# Altium schematic symbol library jlcpcb_2025_04_capacitors_extended_0402.schlib: 3594 symbols (part 14 of 20) (continued)
## GJM1555C1H120FB01D
designator C?  Capacitance: 12pF  (hidden comment: *)
Capacitor, Ceramic (MLCC), 12pF, ±1%, 50V, C0G, ±1%, SMD 0402; Manufacturer: Murata Electronics; Manufacturer Part Number: GJM1555C1H120FB01D; Package Size: 0402; JLCPCB Basic Part: No; JLCPCB Part Number: C161304; Supplier 1: LCSC; Category: Capacitors - MLCC; Supplier Part Number 1: C161304; Tolerance: ±1%; Voltage Rating: 50V; Temperature Coefficient: C0G; RoHS: Yes; ComponentLink1Description: Datasheet; ComponentLink1URL: https://wmsc.lcsc.com/wmsc/upload/file/pdf/v2/lcsc/2304140030_Murata-Electronics-GJM1555C1H120FB01D_C161304.pdf; ComponentLink2Description: JLCPCB Part URL; ComponentLink2URL: https://jlcpcb.com/partdetail/C161304; ComponentLink3Description: LCSC Part URL; ComponentLink3URL: https://lcsc.com/product-detail/Multilayer-Ceramic-Capacitors-MLCC---SMD-SMT_Murata-Electronics-Murata-Electronics-GJM1555C1H120FB01D_C161304.html
footprint CAP-0402 (0402 (1005M) Capacitor)
pins: 1, 2

## GJM1555C1H120GB01D
designator C?  Capacitance: 12pF  (hidden comment: *)
Capacitor, Ceramic (MLCC), 12pF, ±2%, 50V, C0G, ±2%, SMD 0402; Manufacturer: Murata Electronics; Manufacturer Part Number: GJM1555C1H120GB01D; Package Size: 0402; JLCPCB Basic Part: No; JLCPCB Part Number: C161305; Supplier 1: LCSC; Category: Capacitors - MLCC; Supplier Part Number 1: C161305; Tolerance: ±2%; Voltage Rating: 50V; Temperature Coefficient: C0G; RoHS: Yes; ComponentLink1Description: Datasheet; ComponentLink1URL: https://wmsc.lcsc.com/wmsc/upload/file/pdf/v2/lcsc/2304140030_Murata-Electronics-GJM1555C1H120GB01D_C161305.pdf; ComponentLink2Description: JLCPCB Part URL; ComponentLink2URL: https://jlcpcb.com/partdetail/C161305; ComponentLink3Description: LCSC Part URL; ComponentLink3URL: https://lcsc.com/product-detail/Multilayer-Ceramic-Capacitors-MLCC---SMD-SMT_Murata-Electronics-Murata-Electronics-GJM1555C1H120GB01D_C161305.html
footprint CAP-0402 (0402 (1005M) Capacitor)
pins: 1, 2

## GJM1555C1H120JB01D
designator C?  Capacitance: 12pF  (hidden comment: *)
Capacitor, Ceramic (MLCC), 12pF, ±5%, 50V, C0G, ±5%, SMD 0402; Manufacturer: Murata Electronics; Manufacturer Part Number: GJM1555C1H120JB01D; Package Size: 0402; JLCPCB Basic Part: No; JLCPCB Part Number: C85875; Supplier 1: LCSC; Category: Capacitors - MLCC; Supplier Part Number 1: C85875; Tolerance: ±5%; Voltage Rating: 50V; Temperature Coefficient: C0G; RoHS: Yes; ComponentLink1Description: Datasheet; ComponentLink1URL: https://wmsc.lcsc.com/wmsc/upload/file/pdf/v2/lcsc/2304140030_Murata-Electronics-GJM1555C1H120JB01D_C85875.pdf; ComponentLink2Description: JLCPCB Part URL; ComponentLink2URL: https://jlcpcb.com/partdetail/C85875; ComponentLink3Description: LCSC Part URL; ComponentLink3URL: https://lcsc.com/product-detail/Multilayer-Ceramic-Capacitors-MLCC---SMD-SMT_Murata-Electronics-Murata-Electronics-GJM1555C1H120JB01D_C85875.html
footprint CAP-0402 (0402 (1005M) Capacitor)
pins: 1, 2

## GJM1555C1H130FB01D
designator C?  Capacitance: 13pF  (hidden comment: *)
Capacitor, Ceramic (MLCC), 13pF, ±1%, 50V, C0G, ±1%, SMD 0402; Manufacturer: Murata Electronics; Manufacturer Part Number: GJM1555C1H130FB01D; Package Size: 0402; JLCPCB Basic Part: No; JLCPCB Part Number: C161306; Supplier 1: LCSC; Category: Capacitors - MLCC; Supplier Part Number 1: C161306; Tolerance: ±1%; Voltage Rating: 50V; Temperature Coefficient: C0G; RoHS: Yes; ComponentLink1Description: Datasheet; ComponentLink1URL: https://wmsc.lcsc.com/wmsc/upload/file/pdf/v2/lcsc/2304140030_Murata-Electronics-GJM1555C1H130FB01D_C161306.pdf; ComponentLink2Description: JLCPCB Part URL; ComponentLink2URL: https://jlcpcb.com/partdetail/C161306; ComponentLink3Description: LCSC Part URL; ComponentLink3URL: https://lcsc.com/product-detail/Multilayer-Ceramic-Capacitors-MLCC---SMD-SMT_Murata-Electronics-Murata-Electronics-GJM1555C1H130FB01D_C161306.html
footprint CAP-0402 (0402 (1005M) Capacitor)
pins: 1, 2

## GJM1555C1H130GB01D
designator C?  Capacitance: 13pF  (hidden comment: *)
Capacitor, Ceramic (MLCC), 13pF, ±2%, 50V, null, ±2%, SMD 0402; Manufacturer: Murata Electronics; Manufacturer Part Number: GJM1555C1H130GB01D; Package Size: 0402; JLCPCB Basic Part: No; JLCPCB Part Number: C2167421; Supplier 1: LCSC; Category: Capacitors - MLCC; Supplier Part Number 1: C2167421; Tolerance: ±2%; Voltage Rating: 50V; Temperature Coefficient: null; RoHS: Yes; ComponentLink1Description: Datasheet; ComponentLink1URL: https://wmsc.lcsc.com/wmsc/upload/file/pdf/v2/lcsc/2202040230_Murata-Electronics-GJM1555C1H130GB01D_C2167421.pdf; ComponentLink2Description: JLCPCB Part URL; ComponentLink2URL: https://jlcpcb.com/partdetail/C2167421; ComponentLink3Description: LCSC Part URL; ComponentLink3URL: https://lcsc.com/product-detail/Multilayer-Ceramic-Capacitors-MLCC---SMD-SMT_Murata-Electronics-Murata-Electronics-GJM1555C1H130GB01D_C2167421.html
footprint CAP-0402 (0402 (1005M) Capacitor)
pins: 1, 2

## GJM1555C1H130JB01D
designator C?  Capacitance: 13pF  (hidden comment: *)
Capacitor, Ceramic (MLCC), 13pF, ±5%, null, null, ±5%, SMD 0402; Manufacturer: Murata Electronics; Manufacturer Part Number: GJM1555C1H130JB01D; Package Size: 0402; JLCPCB Basic Part: No; JLCPCB Part Number: C426082; Supplier 1: LCSC; Category: Capacitors - MLCC; Supplier Part Number 1: C426082; Tolerance: ±5%; Voltage Rating: null; Temperature Coefficient: null; RoHS: Yes; ComponentLink1Description: Datasheet; ComponentLink1URL: https://wmsc.lcsc.com/wmsc/upload/file/pdf/v2/lcsc/2304140030_Murata-Electronics-GJM1555C1H130JB01D_C426082.pdf; ComponentLink2Description: JLCPCB Part URL; ComponentLink2URL: https://jlcpcb.com/partdetail/C426082; ComponentLink3Description: LCSC Part URL; ComponentLink3URL: https://lcsc.com/product-detail/Multilayer-Ceramic-Capacitors-MLCC---SMD-SMT_Murata-Electronics-Murata-Electronics-GJM1555C1H130JB01D_C426082.html
footprint CAP-0402 (0402 (1005M) Capacitor)
pins: 1, 2

## GJM1555C1H150FB01D
designator C?  Capacitance: 15pF  (hidden comment: *)
Capacitor, Ceramic (MLCC), 15pF, ±1%, 50V, C0G, ±1%, SMD 0402; Manufacturer: Murata Electronics; Manufacturer Part Number: GJM1555C1H150FB01D; Package Size: 0402; JLCPCB Basic Part: No; JLCPCB Part Number: C441742; Supplier 1: LCSC; Category: Capacitors - MLCC; Supplier Part Number 1: C441742; Tolerance: ±1%; Voltage Rating: 50V; Temperature Coefficient: C0G; RoHS: Yes; ComponentLink1Description: Datasheet; ComponentLink1URL: https://wmsc.lcsc.com/wmsc/upload/file/pdf/v2/lcsc/2304140030_Murata-Electronics-GJM1555C1H150FB01D_C441742.pdf; ComponentLink2Description: JLCPCB Part URL; ComponentLink2URL: https://jlcpcb.com/partdetail/C441742; ComponentLink3Description: LCSC Part URL; ComponentLink3URL: https://lcsc.com/product-detail/Multilayer-Ceramic-Capacitors-MLCC---SMD-SMT_Murata-Electronics-Murata-Electronics-GJM1555C1H150FB01D_C441742.html
footprint CAP-0402 (0402 (1005M) Capacitor)
pins: 1, 2

## GJM1555C1H150GB01D
designator C?  Capacitance: 15pF  (hidden comment: *)
Capacitor, Ceramic (MLCC), 15pF, ±2%, null, null, ±2%, SMD 0402; Manufacturer: Murata Electronics; Manufacturer Part Number: GJM1555C1H150GB01D; Package Size: 0402; JLCPCB Basic Part: No; JLCPCB Part Number: C440152; Supplier 1: LCSC; Category: Capacitors - MLCC; Supplier Part Number 1: C440152; Tolerance: ±2%; Voltage Rating: null; Temperature Coefficient: null; RoHS: Yes; ComponentLink1Description: Datasheet; ComponentLink1URL: https://wmsc.lcsc.com/wmsc/upload/file/pdf/v2/lcsc/2304140030_Murata-Electronics-GJM1555C1H150GB01D_C440152.pdf; ComponentLink2Description: JLCPCB Part URL; ComponentLink2URL: https://jlcpcb.com/partdetail/C440152; ComponentLink3Description: LCSC Part URL; ComponentLink3URL: https://lcsc.com/product-detail/Multilayer-Ceramic-Capacitors-MLCC---SMD-SMT_Murata-Electronics-Murata-Electronics-GJM1555C1H150GB01D_C440152.html
footprint CAP-0402 (0402 (1005M) Capacitor)
pins: 1, 2

## GJM1555C1H150JB01D
designator C?  Capacitance: 15pF  (hidden comment: *)
Capacitor, Ceramic (MLCC), 15pF, ±5%, 50V, C0G, ±5%, SMD 0402; Manufacturer: Murata Electronics; Manufacturer Part Number: GJM1555C1H150JB01D; Package Size: 0402; JLCPCB Basic Part: No; JLCPCB Part Number: C88877; Supplier 1: LCSC; Category: Capacitors - MLCC; Supplier Part Number 1: C88877; Tolerance: ±5%; Voltage Rating: 50V; Temperature Coefficient: C0G; RoHS: Yes; ComponentLink1Description: Datasheet; ComponentLink1URL: https://wmsc.lcsc.com/wmsc/upload/file/pdf/v2/lcsc/2304140030_Murata-Electronics-GJM1555C1H150JB01D_C88877.pdf; ComponentLink2Description: JLCPCB Part URL; ComponentLink2URL: https://jlcpcb.com/partdetail/C88877; ComponentLink3Description: LCSC Part URL; ComponentLink3URL: https://lcsc.com/product-detail/Multilayer-Ceramic-Capacitors-MLCC---SMD-SMT_Murata-Electronics-Murata-Electronics-GJM1555C1H150JB01D_C88877.html
footprint CAP-0402 (0402 (1005M) Capacitor)
pins: 1, 2

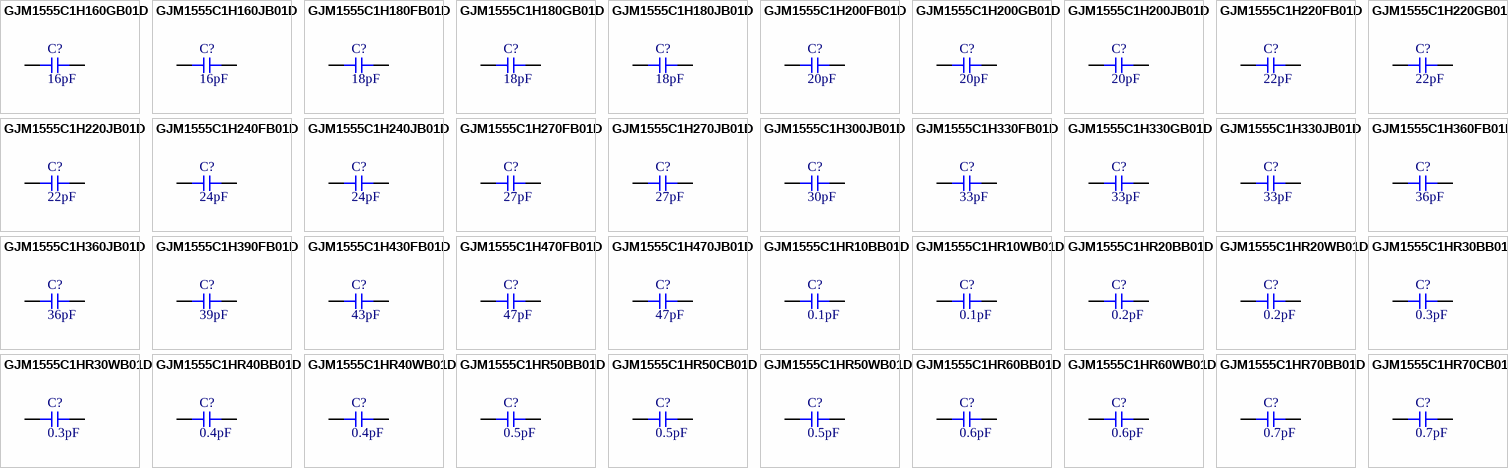
[diagram p64: symbols GJM1555C1H160GB01D to GJM1555C1HR70CB01D]

## GJM1555C1H160GB01D
designator C?  Capacitance: 16pF  (hidden comment: *)
Capacitor, Ceramic (MLCC), 16pF, ±2%, 50V, C0G, ±2%, SMD 0402; Manufacturer: Murata Electronics; Manufacturer Part Number: GJM1555C1H160GB01D; Package Size: 0402; JLCPCB Basic Part: No; JLCPCB Part Number: C161307; Supplier 1: LCSC; Category: Capacitors - MLCC; Supplier Part Number 1: C161307; Tolerance: ±2%; Voltage Rating: 50V; Temperature Coefficient: C0G; RoHS: Yes; ComponentLink1Description: Datasheet; ComponentLink1URL: https://wmsc.lcsc.com/wmsc/upload/file/pdf/v2/lcsc/1811081532_Murata-Electronics-GJM1555C1H160GB01D_C161307.pdf; ComponentLink2Description: JLCPCB Part URL; ComponentLink2URL: https://jlcpcb.com/partdetail/C161307; ComponentLink3Description: LCSC Part URL; ComponentLink3URL: https://lcsc.com/product-detail/Multilayer-Ceramic-Capacitors-MLCC---SMD-SMT_Murata-Electronics-Murata-Electronics-GJM1555C1H160GB01D_C161307.html
footprint CAP-0402 (0402 (1005M) Capacitor)
pins: 1, 2

## GJM1555C1H160JB01D
designator C?  Capacitance: 16pF  (hidden comment: *)
Capacitor, Ceramic (MLCC), 16pF, ±5%, 50V, null, ±5%, SMD 0402; Manufacturer: Murata Electronics; Manufacturer Part Number: GJM1555C1H160JB01D; Package Size: 0402; JLCPCB Basic Part: No; JLCPCB Part Number: C2217274; Supplier 1: LCSC; Category: Capacitors - MLCC; Supplier Part Number 1: C2217274; Tolerance: ±5%; Voltage Rating: 50V; Temperature Coefficient: null; RoHS: Yes; ComponentLink1Description: Datasheet; ComponentLink1URL: https://wmsc.lcsc.com/wmsc/upload/file/pdf/v2/lcsc/2104171546_Murata-Electronics-GJM1555C1H160JB01D_C2217274.pdf; ComponentLink2Description: JLCPCB Part URL; ComponentLink2URL: https://jlcpcb.com/partdetail/C2217274; ComponentLink3Description: LCSC Part URL; ComponentLink3URL: https://lcsc.com/product-detail/Multilayer-Ceramic-Capacitors-MLCC---SMD-SMT_Murata-Electronics-Murata-Electronics-GJM1555C1H160JB01D_C2217274.html
footprint CAP-0402 (0402 (1005M) Capacitor)
pins: 1, 2

## GJM1555C1H180FB01D
designator C?  Capacitance: 18pF  (hidden comment: *)
Capacitor, Ceramic (MLCC), 18pF, ±1%, 50V, C0G, ±1%, SMD 0402; Manufacturer: Murata Electronics; Manufacturer Part Number: GJM1555C1H180FB01D; Package Size: 0402; JLCPCB Basic Part: No; JLCPCB Part Number: C237497; Supplier 1: LCSC; Category: Capacitors - MLCC; Supplier Part Number 1: C237497; Tolerance: ±1%; Voltage Rating: 50V; Temperature Coefficient: C0G; RoHS: Yes; ComponentLink1Description: Datasheet; ComponentLink1URL: https://wmsc.lcsc.com/wmsc/upload/file/pdf/v2/lcsc/1912111437_Murata-Electronics-GJM1555C1H180FB01D_C237497.pdf; ComponentLink2Description: JLCPCB Part URL; ComponentLink2URL: https://jlcpcb.com/partdetail/C237497; ComponentLink3Description: LCSC Part URL; ComponentLink3URL: https://lcsc.com/product-detail/Multilayer-Ceramic-Capacitors-MLCC---SMD-SMT_Murata-Electronics-Murata-Electronics-GJM1555C1H180FB01D_C237497.html
footprint CAP-0402 (0402 (1005M) Capacitor)
pins: 1, 2

## GJM1555C1H180GB01D
designator C?  Capacitance: 18pF  (hidden comment: *)
Capacitor, Ceramic (MLCC), 18pF, ±2%, 50V, C0G, ±2%, SMD 0402; Manufacturer: Murata Electronics; Manufacturer Part Number: GJM1555C1H180GB01D; Package Size: 0402; JLCPCB Basic Part: No; JLCPCB Part Number: C237274; Supplier 1: LCSC; Category: Capacitors - MLCC; Supplier Part Number 1: C237274; Tolerance: ±2%; Voltage Rating: 50V; Temperature Coefficient: C0G; RoHS: Yes; ComponentLink1Description: Datasheet; ComponentLink1URL: https://wmsc.lcsc.com/wmsc/upload/file/pdf/v2/lcsc/1912111437_Murata-Electronics-GJM1555C1H180GB01D_C237274.pdf; ComponentLink2Description: JLCPCB Part URL; ComponentLink2URL: https://jlcpcb.com/partdetail/C237274; ComponentLink3Description: LCSC Part URL; ComponentLink3URL: https://lcsc.com/product-detail/Multilayer-Ceramic-Capacitors-MLCC---SMD-SMT_Murata-Electronics-Murata-Electronics-GJM1555C1H180GB01D_C237274.html
footprint CAP-0402 (0402 (1005M) Capacitor)
pins: 1, 2

## GJM1555C1H180JB01D
designator C?  Capacitance: 18pF  (hidden comment: *)
Capacitor, Ceramic (MLCC), 18pF, ±5%, 50V, C0G, ±5%, SMD 0402; Manufacturer: Murata Electronics; Manufacturer Part Number: GJM1555C1H180JB01D; Package Size: 0402; JLCPCB Basic Part: No; JLCPCB Part Number: C88878; Supplier 1: LCSC; Category: Capacitors - MLCC; Supplier Part Number 1: C88878; Tolerance: ±5%; Voltage Rating: 50V; Temperature Coefficient: C0G; RoHS: Yes; ComponentLink1Description: Datasheet; ComponentLink1URL: https://wmsc.lcsc.com/wmsc/upload/file/pdf/v2/lcsc/2304140030_Murata-Electronics-GJM1555C1H180JB01D_C88878.pdf; ComponentLink2Description: JLCPCB Part URL; ComponentLink2URL: https://jlcpcb.com/partdetail/C88878; ComponentLink3Description: LCSC Part URL; ComponentLink3URL: https://lcsc.com/product-detail/Multilayer-Ceramic-Capacitors-MLCC---SMD-SMT_Murata-Electronics-Murata-Electronics-GJM1555C1H180JB01D_C88878.html
footprint CAP-0402 (0402 (1005M) Capacitor)
pins: 1, 2

## GJM1555C1H200FB01D
designator C?  Capacitance: 20pF  (hidden comment: *)
Capacitor, Ceramic (MLCC), 20pF, ±1%, null, null, ±1%, SMD 0402; Manufacturer: Murata Electronics; Manufacturer Part Number: GJM1555C1H200FB01D; Package Size: 0402; JLCPCB Basic Part: No; JLCPCB Part Number: C913479; Supplier 1: LCSC; Category: Capacitors - MLCC; Supplier Part Number 1: C913479; Tolerance: ±1%; Voltage Rating: null; Temperature Coefficient: null; RoHS: Yes; ComponentLink1Description: Datasheet; ComponentLink1URL: https://wmsc.lcsc.com/wmsc/upload/file/pdf/v2/lcsc/2308111814_Murata-Electronics-GJM1555C1H200FB01D_C913479.pdf; ComponentLink2Description: JLCPCB Part URL; ComponentLink2URL: https://jlcpcb.com/partdetail/C913479; ComponentLink3Description: LCSC Part URL; ComponentLink3URL: https://lcsc.com/product-detail/Multilayer-Ceramic-Capacitors-MLCC---SMD-SMT_Murata-Electronics-Murata-Electronics-GJM1555C1H200FB01D_C913479.html
footprint CAP-0402 (0402 (1005M) Capacitor)
pins: 1, 2

## GJM1555C1H200GB01D
designator C?  Capacitance: 20pF  (hidden comment: *)
Capacitor, Ceramic (MLCC), 20pF, ±2%, null, null, ±2%, SMD 0402; Manufacturer: Murata Electronics; Manufacturer Part Number: GJM1555C1H200GB01D; Package Size: 0402; JLCPCB Basic Part: No; JLCPCB Part Number: C882568; Supplier 1: LCSC; Category: Capacitors - MLCC; Supplier Part Number 1: C882568; Tolerance: ±2%; Voltage Rating: null; Temperature Coefficient: null; RoHS: Yes; ComponentLink1Description: Datasheet; ComponentLink1URL: https://wmsc.lcsc.com/wmsc/upload/file/pdf/v2/lcsc/2201242130_Murata-Electronics-GJM1555C1H200GB01D_C882568.pdf; ComponentLink2Description: JLCPCB Part URL; ComponentLink2URL: https://jlcpcb.com/partdetail/C882568; ComponentLink3Description: LCSC Part URL; ComponentLink3URL: https://lcsc.com/product-detail/Multilayer-Ceramic-Capacitors-MLCC---SMD-SMT_Murata-Electronics-Murata-Electronics-GJM1555C1H200GB01D_C882568.html
footprint CAP-0402 (0402 (1005M) Capacitor)
pins: 1, 2

## GJM1555C1H200JB01D
designator C?  Capacitance: 20pF  (hidden comment: *)
Capacitor, Ceramic (MLCC), 20pF, ±5%, 50V, C0G, ±5%, SMD 0402; Manufacturer: Murata Electronics; Manufacturer Part Number: GJM1555C1H200JB01D; Package Size: 0402; JLCPCB Basic Part: No; JLCPCB Part Number: C2169175; Supplier 1: LCSC; Category: Capacitors - MLCC; Supplier Part Number 1: C2169175; Tolerance: ±5%; Voltage Rating: 50V; Temperature Coefficient: C0G; RoHS: Yes; ComponentLink1Description: Datasheet; ComponentLink1URL: https://wmsc.lcsc.com/wmsc/upload/file/pdf/v2/lcsc/2202040330_Murata-Electronics-GJM1555C1H200JB01D_C2169175.pdf; ComponentLink2Description: JLCPCB Part URL; ComponentLink2URL: https://jlcpcb.com/partdetail/C2169175; ComponentLink3Description: LCSC Part URL; ComponentLink3URL: https://lcsc.com/product-detail/Multilayer-Ceramic-Capacitors-MLCC---SMD-SMT_Murata-Electronics-Murata-Electronics-GJM1555C1H200JB01D_C2169175.html
footprint CAP-0402 (0402 (1005M) Capacitor)
pins: 1, 2

## GJM1555C1H220FB01D
designator C?  Capacitance: 22pF  (hidden comment: *)
Capacitor, Ceramic (MLCC), 22pF, ±1%, 50V, null, ±1%, SMD 0402; Manufacturer: Murata Electronics; Manufacturer Part Number: GJM1555C1H220FB01D; Package Size: 0402; JLCPCB Basic Part: No; JLCPCB Part Number: C882567; Supplier 1: LCSC; Category: Capacitors - MLCC; Supplier Part Number 1: C882567; Tolerance: ±1%; Voltage Rating: 50V; Temperature Coefficient: null; RoHS: Yes; ComponentLink1Description: Datasheet; ComponentLink1URL: https://wmsc.lcsc.com/wmsc/upload/file/pdf/v2/lcsc/2201242130_Murata-Electronics-GJM1555C1H220FB01D_C882567.pdf; ComponentLink2Description: JLCPCB Part URL; ComponentLink2URL: https://jlcpcb.com/partdetail/C882567; ComponentLink3Description: LCSC Part URL; ComponentLink3URL: https://lcsc.com/product-detail/Multilayer-Ceramic-Capacitors-MLCC---SMD-SMT_Murata-Electronics-Murata-Electronics-GJM1555C1H220FB01D_C882567.html
footprint CAP-0402 (0402 (1005M) Capacitor)
pins: 1, 2

## GJM1555C1H220GB01D
designator C?  Capacitance: 22pF  (hidden comment: *)
Capacitor, Ceramic (MLCC), 22pF, ±2%, 50V, C0G, ±2%, SMD 0402; Manufacturer: Murata Electronics; Manufacturer Part Number: GJM1555C1H220GB01D; Package Size: 0402; JLCPCB Basic Part: No; JLCPCB Part Number: C161315; Supplier 1: LCSC; Category: Capacitors - MLCC; Supplier Part Number 1: C161315; Tolerance: ±2%; Voltage Rating: 50V; Temperature Coefficient: C0G; RoHS: Yes; ComponentLink1Description: Datasheet; ComponentLink1URL: https://wmsc.lcsc.com/wmsc/upload/file/pdf/v2/lcsc/2304140030_Murata-Electronics-GJM1555C1H220GB01D_C161315.pdf; ComponentLink2Description: JLCPCB Part URL; ComponentLink2URL: https://jlcpcb.com/partdetail/C161315; ComponentLink3Description: LCSC Part URL; ComponentLink3URL: https://lcsc.com/product-detail/Multilayer-Ceramic-Capacitors-MLCC---SMD-SMT_Murata-Electronics-Murata-Electronics-GJM1555C1H220GB01D_C161315.html
footprint CAP-0402 (0402 (1005M) Capacitor)
pins: 1, 2

## GJM1555C1H220JB01D
designator C?  Capacitance: 22pF  (hidden comment: *)
Capacitor, Ceramic (MLCC), 22pF, ±5%, 50V, C0G, ±5%, SMD 0402; Manufacturer: Murata Electronics; Manufacturer Part Number: GJM1555C1H220JB01D; Package Size: 0402; JLCPCB Basic Part: No; JLCPCB Part Number: C88882; Supplier 1: LCSC; Category: Capacitors - MLCC; Supplier Part Number 1: C88882; Tolerance: ±5%; Voltage Rating: 50V; Temperature Coefficient: C0G; RoHS: Yes; ComponentLink1Description: Datasheet; ComponentLink1URL: https://wmsc.lcsc.com/wmsc/upload/file/pdf/v2/lcsc/2304140030_Murata-Electronics-GJM1555C1H220JB01D_C88882.pdf; ComponentLink2Description: JLCPCB Part URL; ComponentLink2URL: https://jlcpcb.com/partdetail/C88882; ComponentLink3Description: LCSC Part URL; ComponentLink3URL: https://lcsc.com/product-detail/Multilayer-Ceramic-Capacitors-MLCC---SMD-SMT_Murata-Electronics-Murata-Electronics-GJM1555C1H220JB01D_C88882.html
footprint CAP-0402 (0402 (1005M) Capacitor)
pins: 1, 2

## GJM1555C1H240FB01D
designator C?  Capacitance: 24pF  (hidden comment: *)
Capacitor, Ceramic (MLCC), 24pF, ±1%, 50V, C0G, ±1%, SMD 0402; Manufacturer: Murata Electronics; Manufacturer Part Number: GJM1555C1H240FB01D; Package Size: 0402; JLCPCB Basic Part: No; JLCPCB Part Number: C415394; Supplier 1: LCSC; Category: Capacitors - MLCC; Supplier Part Number 1: C415394; Tolerance: ±1%; Voltage Rating: 50V; Temperature Coefficient: C0G; RoHS: Yes; ComponentLink1Description: Datasheet; ComponentLink1URL: https://wmsc.lcsc.com/wmsc/upload/file/pdf/v2/lcsc/2304140030_Murata-Electronics-GJM1555C1H240FB01D_C415394.pdf; ComponentLink2Description: JLCPCB Part URL; ComponentLink2URL: https://jlcpcb.com/partdetail/C415394; ComponentLink3Description: LCSC Part URL; ComponentLink3URL: https://lcsc.com/product-detail/Multilayer-Ceramic-Capacitors-MLCC---SMD-SMT_Murata-Electronics-Murata-Electronics-GJM1555C1H240FB01D_C415394.html
footprint CAP-0402 (0402 (1005M) Capacitor)
pins: 1, 2

## GJM1555C1H240JB01D
designator C?  Capacitance: 24pF  (hidden comment: *)
Capacitor, Ceramic (MLCC), 24pF, ±5%, 50V, null, ±5%, SMD 0402; Manufacturer: Murata Electronics; Manufacturer Part Number: GJM1555C1H240JB01D; Package Size: 0402; JLCPCB Basic Part: No; JLCPCB Part Number: C2177214; Supplier 1: LCSC; Category: Capacitors - MLCC; Supplier Part Number 1: C2177214; Tolerance: ±5%; Voltage Rating: 50V; Temperature Coefficient: null; RoHS: Yes; ComponentLink1Description: Datasheet; ComponentLink1URL: https://wmsc.lcsc.com/wmsc/upload/file/pdf/v2/lcsc/2202040900_Murata-Electronics-GJM1555C1H240JB01D_C2177214.pdf; ComponentLink2Description: JLCPCB Part URL; ComponentLink2URL: https://jlcpcb.com/partdetail/C2177214; ComponentLink3Description: LCSC Part URL; ComponentLink3URL: https://lcsc.com/product-detail/Multilayer-Ceramic-Capacitors-MLCC---SMD-SMT_Murata-Electronics-Murata-Electronics-GJM1555C1H240JB01D_C2177214.html
footprint CAP-0402 (0402 (1005M) Capacitor)
pins: 1, 2

## GJM1555C1H270FB01D
designator C?  Capacitance: 27pF  (hidden comment: *)
Capacitor, Ceramic (MLCC), 27pF, ±1%, 50V, C0G, ±1%, SMD 0402; Manufacturer: Murata Electronics; Manufacturer Part Number: GJM1555C1H270FB01D; Package Size: 0402; JLCPCB Basic Part: No; JLCPCB Part Number: C88883; Supplier 1: LCSC; Category: Capacitors - MLCC; Supplier Part Number 1: C88883; Tolerance: ±1%; Voltage Rating: 50V; Temperature Coefficient: C0G; RoHS: Yes; ComponentLink1Description: Datasheet; ComponentLink1URL: https://wmsc.lcsc.com/wmsc/upload/file/pdf/v2/lcsc/2304140030_Murata-Electronics-GJM1555C1H270FB01D_C88883.pdf; ComponentLink2Description: JLCPCB Part URL; ComponentLink2URL: https://jlcpcb.com/partdetail/C88883; ComponentLink3Description: LCSC Part URL; ComponentLink3URL: https://lcsc.com/product-detail/Multilayer-Ceramic-Capacitors-MLCC---SMD-SMT_Murata-Electronics-Murata-Electronics-GJM1555C1H270FB01D_C88883.html
footprint CAP-0402 (0402 (1005M) Capacitor)
pins: 1, 2

## GJM1555C1H270JB01D
designator C?  Capacitance: 27pF  (hidden comment: *)
Capacitor, Ceramic (MLCC), 27pF, ±5%, 50V, C0G, ±5%, SMD 0402; Manufacturer: Murata Electronics; Manufacturer Part Number: GJM1555C1H270JB01D; Package Size: 0402; JLCPCB Basic Part: No; JLCPCB Part Number: C88884; Supplier 1: LCSC; Category: Capacitors - MLCC; Supplier Part Number 1: C88884; Tolerance: ±5%; Voltage Rating: 50V; Temperature Coefficient: C0G; RoHS: Yes; ComponentLink1Description: Datasheet; ComponentLink1URL: https://wmsc.lcsc.com/wmsc/upload/file/pdf/v2/lcsc/2304140030_Murata-Electronics-GJM1555C1H270JB01D_C88884.pdf; ComponentLink2Description: JLCPCB Part URL; ComponentLink2URL: https://jlcpcb.com/partdetail/C88884; ComponentLink3Description: LCSC Part URL; ComponentLink3URL: https://lcsc.com/product-detail/Multilayer-Ceramic-Capacitors-MLCC---SMD-SMT_Murata-Electronics-Murata-Electronics-GJM1555C1H270JB01D_C88884.html
footprint CAP-0402 (0402 (1005M) Capacitor)
pins: 1, 2

## GJM1555C1H300JB01D
designator C?  Capacitance: 30pF  (hidden comment: *)
Capacitor, Ceramic (MLCC), 30pF, ±5%, 50V, C0G, ±5%, SMD 0402; Manufacturer: Murata Electronics; Manufacturer Part Number: GJM1555C1H300JB01D; Package Size: 0402; JLCPCB Basic Part: No; JLCPCB Part Number: C3870596; Supplier 1: LCSC; Category: Capacitors - MLCC; Supplier Part Number 1: C3870596; Tolerance: ±5%; Voltage Rating: 50V; Temperature Coefficient: C0G; RoHS: Yes; ComponentLink1Description: Datasheet; ComponentLink1URL: https://wmsc.lcsc.com/wmsc/upload/file/pdf/v2/lcsc/2308111753_Murata-Electronics-GJM1555C1H300JB01D_C3870596.pdf; ComponentLink2Description: JLCPCB Part URL; ComponentLink2URL: https://jlcpcb.com/partdetail/C3870596; ComponentLink3Description: LCSC Part URL; ComponentLink3URL: https://lcsc.com/product-detail/Multilayer-Ceramic-Capacitors-MLCC---SMD-SMT_Murata-Electronics-Murata-Electronics-GJM1555C1H300JB01D_C3870596.html
footprint CAP-0402 (0402 (1005M) Capacitor)
pins: 1, 2

## GJM1555C1H330FB01D
designator C?  Capacitance: 33pF  (hidden comment: *)
Capacitor, Ceramic (MLCC), 33pF, ±1%, 50V, C0G, ±1%, SMD 0402; Manufacturer: Murata Electronics; Manufacturer Part Number: GJM1555C1H330FB01D; Package Size: 0402; JLCPCB Basic Part: No; JLCPCB Part Number: C464434; Supplier 1: LCSC; Category: Capacitors - MLCC; Supplier Part Number 1: C464434; Tolerance: ±1%; Voltage Rating: 50V; Temperature Coefficient: C0G; RoHS: Yes; ComponentLink1Description: Datasheet; ComponentLink1URL: https://wmsc.lcsc.com/wmsc/upload/file/pdf/v2/lcsc/2304140030_Murata-Electronics-GJM1555C1H330FB01D_C464434.pdf; ComponentLink2Description: JLCPCB Part URL; ComponentLink2URL: https://jlcpcb.com/partdetail/C464434; ComponentLink3Description: LCSC Part URL; ComponentLink3URL: https://lcsc.com/product-detail/Multilayer-Ceramic-Capacitors-MLCC---SMD-SMT_Murata-Electronics-Murata-Electronics-GJM1555C1H330FB01D_C464434.html
footprint CAP-0402 (0402 (1005M) Capacitor)
pins: 1, 2

## GJM1555C1H330GB01D
designator C?  Capacitance: 33pF  (hidden comment: *)
Capacitor, Ceramic (MLCC), 33pF, ±2%, 50V, C0G, ±2%, SMD 0402; Manufacturer: Murata Electronics; Manufacturer Part Number: GJM1555C1H330GB01D; Package Size: 0402; JLCPCB Basic Part: No; JLCPCB Part Number: C76905; Supplier 1: LCSC; Category: Capacitors - MLCC; Supplier Part Number 1: C76905; Tolerance: ±2%; Voltage Rating: 50V; Temperature Coefficient: C0G; RoHS: Yes; ComponentLink1Description: Datasheet; ComponentLink1URL: https://wmsc.lcsc.com/wmsc/upload/file/pdf/v2/lcsc/1811081610_Murata-Electronics-GJM1555C1H330GB01D_C76905.pdf; ComponentLink2Description: JLCPCB Part URL; ComponentLink2URL: https://jlcpcb.com/partdetail/C76905; ComponentLink3Description: LCSC Part URL; ComponentLink3URL: https://lcsc.com/product-detail/Multilayer-Ceramic-Capacitors-MLCC---SMD-SMT_Murata-Electronics-Murata-Electronics-GJM1555C1H330GB01D_C76905.html
footprint CAP-0402 (0402 (1005M) Capacitor)
pins: 1, 2

## GJM1555C1H330JB01D
designator C?  Capacitance: 33pF  (hidden comment: *)
Capacitor, Ceramic (MLCC), 33pF, ±5%, null, null, ±5%, SMD 0402; Manufacturer: Murata Electronics; Manufacturer Part Number: GJM1555C1H330JB01D; Package Size: 0402; JLCPCB Basic Part: No; JLCPCB Part Number: C426031; Supplier 1: LCSC; Category: Capacitors - MLCC; Supplier Part Number 1: C426031; Tolerance: ±5%; Voltage Rating: null; Temperature Coefficient: null; RoHS: Yes; ComponentLink1Description: Datasheet; ComponentLink1URL: https://wmsc.lcsc.com/wmsc/upload/file/pdf/v2/lcsc/2304140030_Murata-Electronics-GJM1555C1H330JB01D_C426031.pdf; ComponentLink2Description: JLCPCB Part URL; ComponentLink2URL: https://jlcpcb.com/partdetail/C426031; ComponentLink3Description: LCSC Part URL; ComponentLink3URL: https://lcsc.com/product-detail/Multilayer-Ceramic-Capacitors-MLCC---SMD-SMT_Murata-Electronics-Murata-Electronics-GJM1555C1H330JB01D_C426031.html
footprint CAP-0402 (0402 (1005M) Capacitor)
pins: 1, 2

## GJM1555C1H360FB01D
designator C?  Capacitance: 36pF  (hidden comment: *)
Capacitor, Ceramic (MLCC), 36pF, ±1%, 50V, C0G, ±1%, SMD 0402; Manufacturer: Murata Electronics; Manufacturer Part Number: GJM1555C1H360FB01D; Package Size: 0402; JLCPCB Basic Part: No; JLCPCB Part Number: C415391; Supplier 1: LCSC; Category: Capacitors - MLCC; Supplier Part Number 1: C415391; Tolerance: ±1%; Voltage Rating: 50V; Temperature Coefficient: C0G; RoHS: Yes; ComponentLink1Description: Datasheet; ComponentLink1URL: https://wmsc.lcsc.com/wmsc/upload/file/pdf/v2/lcsc/2304140030_Murata-Electronics-GJM1555C1H360FB01D_C415391.pdf; ComponentLink2Description: JLCPCB Part URL; ComponentLink2URL: https://jlcpcb.com/partdetail/C415391; ComponentLink3Description: LCSC Part URL; ComponentLink3URL: https://lcsc.com/product-detail/Multilayer-Ceramic-Capacitors-MLCC---SMD-SMT_Murata-Electronics-Murata-Electronics-GJM1555C1H360FB01D_C415391.html
footprint CAP-0402 (0402 (1005M) Capacitor)
pins: 1, 2

## GJM1555C1H360JB01D
designator C?  Capacitance: 36pF  (hidden comment: *)
Capacitor, Ceramic (MLCC), 36pF, ±5%, 50V, C0G, ±5%, SMD 0402; Manufacturer: Murata Electronics; Manufacturer Part Number: GJM1555C1H360JB01D; Package Size: 0402; JLCPCB Basic Part: No; JLCPCB Part Number: C126324; Supplier 1: LCSC; Category: Capacitors - MLCC; Supplier Part Number 1: C126324; Tolerance: ±5%; Voltage Rating: 50V; Temperature Coefficient: C0G; RoHS: Yes; ComponentLink1Description: Datasheet; ComponentLink1URL: https://wmsc.lcsc.com/wmsc/upload/file/pdf/v2/lcsc/1811081520_Murata-Electronics-GJM1555C1H360JB01D_C126324.pdf; ComponentLink2Description: JLCPCB Part URL; ComponentLink2URL: https://jlcpcb.com/partdetail/C126324; ComponentLink3Description: LCSC Part URL; ComponentLink3URL: https://lcsc.com/product-detail/Multilayer-Ceramic-Capacitors-MLCC---SMD-SMT_Murata-Electronics-Murata-Electronics-GJM1555C1H360JB01D_C126324.html
footprint CAP-0402 (0402 (1005M) Capacitor)
pins: 1, 2

## GJM1555C1H390FB01D
designator C?  Capacitance: 39pF  (hidden comment: *)
Capacitor, Ceramic (MLCC), 39pF, ±1%, null, null, ±1%, SMD 0402; Manufacturer: Murata Electronics; Manufacturer Part Number: GJM1555C1H390FB01D; Package Size: 0402; JLCPCB Basic Part: No; JLCPCB Part Number: C882564; Supplier 1: LCSC; Category: Capacitors - MLCC; Supplier Part Number 1: C882564; Tolerance: ±1%; Voltage Rating: null; Temperature Coefficient: null; RoHS: Yes; ComponentLink1Description: Datasheet; ComponentLink1URL: https://wmsc.lcsc.com/wmsc/upload/file/pdf/v2/lcsc/2201242130_Murata-Electronics-GJM1555C1H390FB01D_C882564.pdf; ComponentLink2Description: JLCPCB Part URL; ComponentLink2URL: https://jlcpcb.com/partdetail/C882564; ComponentLink3Description: LCSC Part URL; ComponentLink3URL: https://lcsc.com/product-detail/Multilayer-Ceramic-Capacitors-MLCC---SMD-SMT_Murata-Electronics-Murata-Electronics-GJM1555C1H390FB01D_C882564.html
footprint CAP-0402 (0402 (1005M) Capacitor)
pins: 1, 2

## GJM1555C1H430FB01D
designator C?  Capacitance: 43pF  (hidden comment: *)
Capacitor, Ceramic (MLCC), 43pF, ±1%, 50V, C0G, ±1%, SMD 0402; Manufacturer: Murata Electronics; Manufacturer Part Number: GJM1555C1H430FB01D; Package Size: 0402; JLCPCB Basic Part: No; JLCPCB Part Number: C415393; Supplier 1: LCSC; Category: Capacitors - MLCC; Supplier Part Number 1: C415393; Tolerance: ±1%; Voltage Rating: 50V; Temperature Coefficient: C0G; RoHS: Yes; ComponentLink1Description: Datasheet; ComponentLink1URL: https://wmsc.lcsc.com/wmsc/upload/file/pdf/v2/lcsc/2304140030_Murata-Electronics-GJM1555C1H430FB01D_C415393.pdf; ComponentLink2Description: JLCPCB Part URL; ComponentLink2URL: https://jlcpcb.com/partdetail/C415393; ComponentLink3Description: LCSC Part URL; ComponentLink3URL: https://lcsc.com/product-detail/Multilayer-Ceramic-Capacitors-MLCC---SMD-SMT_Murata-Electronics-Murata-Electronics-GJM1555C1H430FB01D_C415393.html
footprint CAP-0402 (0402 (1005M) Capacitor)
pins: 1, 2

## GJM1555C1H470FB01D
designator C?  Capacitance: 47pF  (hidden comment: *)
Capacitor, Ceramic (MLCC), 47pF, ±1%, null, null, ±1%, SMD 0402; Manufacturer: Murata Electronics; Manufacturer Part Number: GJM1555C1H470FB01D; Package Size: 0402; JLCPCB Basic Part: No; JLCPCB Part Number: C882562; Supplier 1: LCSC; Category: Capacitors - MLCC; Supplier Part Number 1: C882562; Tolerance: ±1%; Voltage Rating: null; Temperature Coefficient: null; RoHS: Yes; ComponentLink1Description: Datasheet; ComponentLink1URL: https://wmsc.lcsc.com/wmsc/upload/file/pdf/v2/lcsc/2201242130_Murata-Electronics-GJM1555C1H470FB01D_C882562.pdf; ComponentLink2Description: JLCPCB Part URL; ComponentLink2URL: https://jlcpcb.com/partdetail/C882562; ComponentLink3Description: LCSC Part URL; ComponentLink3URL: https://lcsc.com/product-detail/Multilayer-Ceramic-Capacitors-MLCC---SMD-SMT_Murata-Electronics-Murata-Electronics-GJM1555C1H470FB01D_C882562.html
footprint CAP-0402 (0402 (1005M) Capacitor)
pins: 1, 2

## GJM1555C1H470JB01D
designator C?  Capacitance: 47pF  (hidden comment: *)
Capacitor, Ceramic (MLCC), 47pF, ±5%, 50V, C0G, ±5%, SMD 0402; Manufacturer: Murata Electronics; Manufacturer Part Number: GJM1555C1H470JB01D; Package Size: 0402; JLCPCB Basic Part: No; JLCPCB Part Number: C161322; Supplier 1: LCSC; Category: Capacitors - MLCC; Supplier Part Number 1: C161322; Tolerance: ±5%; Voltage Rating: 50V; Temperature Coefficient: C0G; RoHS: Yes; ComponentLink1Description: Datasheet; ComponentLink1URL: https://wmsc.lcsc.com/wmsc/upload/file/pdf/v2/lcsc/2304140030_Murata-Electronics-GJM1555C1H470JB01D_C161322.pdf; ComponentLink2Description: JLCPCB Part URL; ComponentLink2URL: https://jlcpcb.com/partdetail/C161322; ComponentLink3Description: LCSC Part URL; ComponentLink3URL: https://lcsc.com/product-detail/Multilayer-Ceramic-Capacitors-MLCC---SMD-SMT_Murata-Electronics-Murata-Electronics-GJM1555C1H470JB01D_C161322.html
footprint CAP-0402 (0402 (1005M) Capacitor)
pins: 1, 2

## GJM1555C1HR10BB01D
designator C?  Capacitance: 0.1pF  (hidden comment: *)
Capacitor, Ceramic (MLCC), 0.1pF, null, null, SMD 0402; Manufacturer: Murata Electronics; Manufacturer Part Number: GJM1555C1HR10BB01D; Package Size: 0402; JLCPCB Basic Part: No; JLCPCB Part Number: C527616; Supplier 1: LCSC; Category: Capacitors - MLCC; Supplier Part Number 1: C527616; Voltage Rating: null; Temperature Coefficient: null; RoHS: Yes; ComponentLink1Description: Datasheet; ComponentLink1URL: https://wmsc.lcsc.com/wmsc/upload/file/pdf/v2/lcsc/2304140030_Murata-Electronics-GJM1555C1HR10BB01D_C527616.pdf; ComponentLink2Description: JLCPCB Part URL; ComponentLink2URL: https://jlcpcb.com/partdetail/C527616; ComponentLink3Description: LCSC Part URL; ComponentLink3URL: https://lcsc.com/product-detail/Multilayer-Ceramic-Capacitors-MLCC---SMD-SMT_Murata-Electronics-Murata-Electronics-GJM1555C1HR10BB01D_C527616.html
footprint CAP-0402 (0402 (1005M) Capacitor)
pins: 1, 2

## GJM1555C1HR10WB01D
designator C?  Capacitance: 0.1pF  (hidden comment: *)
Capacitor, Ceramic (MLCC), 0.1pF, 50V, C0G, SMD 0402; Manufacturer: Murata Electronics; Manufacturer Part Number: GJM1555C1HR10WB01D; Package Size: 0402; JLCPCB Basic Part: No; JLCPCB Part Number: C161338; Supplier 1: LCSC; Category: Capacitors - MLCC; Supplier Part Number 1: C161338; Voltage Rating: 50V; Temperature Coefficient: C0G; RoHS: Yes; ComponentLink1Description: Datasheet; ComponentLink1URL: https://wmsc.lcsc.com/wmsc/upload/file/pdf/v2/lcsc/2304140030_Murata-Electronics-GJM1555C1HR10WB01D_C161338.pdf; ComponentLink2Description: JLCPCB Part URL; ComponentLink2URL: https://jlcpcb.com/partdetail/C161338; ComponentLink3Description: LCSC Part URL; ComponentLink3URL: https://lcsc.com/product-detail/Multilayer-Ceramic-Capacitors-MLCC---SMD-SMT_Murata-Electronics-Murata-Electronics-GJM1555C1HR10WB01D_C161338.html
footprint CAP-0402 (0402 (1005M) Capacitor)
pins: 1, 2

## GJM1555C1HR20BB01D
designator C?  Capacitance: 0.2pF  (hidden comment: *)
Capacitor, Ceramic (MLCC), 0.2pF, 50V, C0G, SMD 0402; Manufacturer: Murata Electronics; Manufacturer Part Number: GJM1555C1HR20BB01D; Package Size: 0402; JLCPCB Basic Part: No; JLCPCB Part Number: C161339; Supplier 1: LCSC; Category: Capacitors - MLCC; Supplier Part Number 1: C161339; Voltage Rating: 50V; Temperature Coefficient: C0G; RoHS: Yes; ComponentLink1Description: Datasheet; ComponentLink1URL: https://wmsc.lcsc.com/wmsc/upload/file/pdf/v2/lcsc/1811081521_Murata-Electronics-GJM1555C1HR20BB01D_C161339.pdf; ComponentLink2Description: JLCPCB Part URL; ComponentLink2URL: https://jlcpcb.com/partdetail/C161339; ComponentLink3Description: LCSC Part URL; ComponentLink3URL: https://lcsc.com/product-detail/Multilayer-Ceramic-Capacitors-MLCC---SMD-SMT_Murata-Electronics-Murata-Electronics-GJM1555C1HR20BB01D_C161339.html
footprint CAP-0402 (0402 (1005M) Capacitor)
pins: 1, 2

## GJM1555C1HR20WB01D
designator C?  Capacitance: 0.2pF  (hidden comment: *)
Capacitor, Ceramic (MLCC), 0.2pF, 50V, C0G, SMD 0402; Manufacturer: Murata Electronics; Manufacturer Part Number: GJM1555C1HR20WB01D; Package Size: 0402; JLCPCB Basic Part: No; JLCPCB Part Number: C76908; Supplier 1: LCSC; Category: Capacitors - MLCC; Supplier Part Number 1: C76908; Voltage Rating: 50V; Temperature Coefficient: C0G; RoHS: Yes; ComponentLink1Description: Datasheet; ComponentLink1URL: https://wmsc.lcsc.com/wmsc/upload/file/pdf/v2/lcsc/1811081610_Murata-Electronics-GJM1555C1HR20WB01D_C76908.pdf; ComponentLink2Description: JLCPCB Part URL; ComponentLink2URL: https://jlcpcb.com/partdetail/C76908; ComponentLink3Description: LCSC Part URL; ComponentLink3URL: https://lcsc.com/product-detail/Multilayer-Ceramic-Capacitors-MLCC---SMD-SMT_Murata-Electronics-Murata-Electronics-GJM1555C1HR20WB01D_C76908.html
footprint CAP-0402 (0402 (1005M) Capacitor)
pins: 1, 2

## GJM1555C1HR30BB01D
designator C?  Capacitance: 0.3pF  (hidden comment: *)
Capacitor, Ceramic (MLCC), 0.3pF, 50V, C0G, SMD 0402; Manufacturer: Murata Electronics; Manufacturer Part Number: GJM1555C1HR30BB01D; Package Size: 0402; JLCPCB Basic Part: No; JLCPCB Part Number: C85885; Supplier 1: LCSC; Category: Capacitors - MLCC; Supplier Part Number 1: C85885; Voltage Rating: 50V; Temperature Coefficient: C0G; RoHS: Yes; ComponentLink1Description: Datasheet; ComponentLink1URL: https://wmsc.lcsc.com/wmsc/upload/file/pdf/v2/lcsc/2304140030_Murata-Electronics-GJM1555C1HR30BB01D_C85885.pdf; ComponentLink2Description: JLCPCB Part URL; ComponentLink2URL: https://jlcpcb.com/partdetail/C85885; ComponentLink3Description: LCSC Part URL; ComponentLink3URL: https://lcsc.com/product-detail/Multilayer-Ceramic-Capacitors-MLCC---SMD-SMT_Murata-Electronics-Murata-Electronics-GJM1555C1HR30BB01D_C85885.html
footprint CAP-0402 (0402 (1005M) Capacitor)
pins: 1, 2

## GJM1555C1HR30WB01D
designator C?  Capacitance: 0.3pF  (hidden comment: *)
Capacitor, Ceramic (MLCC), 0.3pF, 50V, C0G, SMD 0402; Manufacturer: Murata Electronics; Manufacturer Part Number: GJM1555C1HR30WB01D; Package Size: 0402; JLCPCB Basic Part: No; JLCPCB Part Number: C76909; Supplier 1: LCSC; Category: Capacitors - MLCC; Supplier Part Number 1: C76909; Voltage Rating: 50V; Temperature Coefficient: C0G; RoHS: Yes; ComponentLink1Description: Datasheet; ComponentLink1URL: https://wmsc.lcsc.com/wmsc/upload/file/pdf/v2/lcsc/1811081710_Murata-Electronics-GJM1555C1HR30WB01D_C76909.pdf; ComponentLink2Description: JLCPCB Part URL; ComponentLink2URL: https://jlcpcb.com/partdetail/C76909; ComponentLink3Description: LCSC Part URL; ComponentLink3URL: https://lcsc.com/product-detail/Multilayer-Ceramic-Capacitors-MLCC---SMD-SMT_Murata-Electronics-Murata-Electronics-GJM1555C1HR30WB01D_C76909.html
footprint CAP-0402 (0402 (1005M) Capacitor)
pins: 1, 2

## GJM1555C1HR40BB01D
designator C?  Capacitance: 0.4pF  (hidden comment: *)
Capacitor, Ceramic (MLCC), 0.4pF, 50V, C0G, SMD 0402; Manufacturer: Murata Electronics; Manufacturer Part Number: GJM1555C1HR40BB01D; Package Size: 0402; JLCPCB Basic Part: No; JLCPCB Part Number: C76910; Supplier 1: LCSC; Category: Capacitors - MLCC; Supplier Part Number 1: C76910; Voltage Rating: 50V; Temperature Coefficient: C0G; RoHS: Yes; ComponentLink1Description: Datasheet; ComponentLink1URL: https://wmsc.lcsc.com/wmsc/upload/file/pdf/v2/lcsc/1811081611_Murata-Electronics-GJM1555C1HR40BB01D_C76910.pdf; ComponentLink2Description: JLCPCB Part URL; ComponentLink2URL: https://jlcpcb.com/partdetail/C76910; ComponentLink3Description: LCSC Part URL; ComponentLink3URL: https://lcsc.com/product-detail/Multilayer-Ceramic-Capacitors-MLCC---SMD-SMT_Murata-Electronics-Murata-Electronics-GJM1555C1HR40BB01D_C76910.html
footprint CAP-0402 (0402 (1005M) Capacitor)
pins: 1, 2

## GJM1555C1HR40WB01D
designator C?  Capacitance: 0.4pF  (hidden comment: *)
Capacitor, Ceramic (MLCC), 0.4pF, 50V, C0G, SMD 0402; Manufacturer: Murata Electronics; Manufacturer Part Number: GJM1555C1HR40WB01D; Package Size: 0402; JLCPCB Basic Part: No; JLCPCB Part Number: C88900; Supplier 1: LCSC; Category: Capacitors - MLCC; Supplier Part Number 1: C88900; Voltage Rating: 50V; Temperature Coefficient: C0G; RoHS: Yes; ComponentLink1Description: Datasheet; ComponentLink1URL: https://wmsc.lcsc.com/wmsc/upload/file/pdf/v2/lcsc/2304140030_Murata-Electronics-GJM1555C1HR40WB01D_C88900.pdf; ComponentLink2Description: JLCPCB Part URL; ComponentLink2URL: https://jlcpcb.com/partdetail/C88900; ComponentLink3Description: LCSC Part URL; ComponentLink3URL: https://lcsc.com/product-detail/Multilayer-Ceramic-Capacitors-MLCC---SMD-SMT_Murata-Electronics-Murata-Electronics-GJM1555C1HR40WB01D_C88900.html
footprint CAP-0402 (0402 (1005M) Capacitor)
pins: 1, 2

## GJM1555C1HR50BB01D
designator C?  Capacitance: 0.5pF  (hidden comment: *)
Capacitor, Ceramic (MLCC), 0.5pF, 50V, C0G, SMD 0402; Manufacturer: Murata Electronics; Manufacturer Part Number: GJM1555C1HR50BB01D; Package Size: 0402; JLCPCB Basic Part: No; JLCPCB Part Number: C76911; Supplier 1: LCSC; Category: Capacitors - MLCC; Supplier Part Number 1: C76911; Voltage Rating: 50V; Temperature Coefficient: C0G; RoHS: Yes; ComponentLink1Description: Datasheet; ComponentLink1URL: https://wmsc.lcsc.com/wmsc/upload/file/pdf/v2/lcsc/1811081611_Murata-Electronics-GJM1555C1HR50BB01D_C76911.pdf; ComponentLink2Description: JLCPCB Part URL; ComponentLink2URL: https://jlcpcb.com/partdetail/C76911; ComponentLink3Description: LCSC Part URL; ComponentLink3URL: https://lcsc.com/product-detail/Multilayer-Ceramic-Capacitors-MLCC---SMD-SMT_Murata-Electronics-Murata-Electronics-GJM1555C1HR50BB01D_C76911.html
footprint CAP-0402 (0402 (1005M) Capacitor)
pins: 1, 2

## GJM1555C1HR50CB01D
designator C?  Capacitance: 0.5pF  (hidden comment: *)
Capacitor, Ceramic (MLCC), 0.5pF, 50V, C0G, SMD 0402; Manufacturer: Murata Electronics; Manufacturer Part Number: GJM1555C1HR50CB01D; Package Size: 0402; JLCPCB Basic Part: No; JLCPCB Part Number: C426102; Supplier 1: LCSC; Category: Capacitors - MLCC; Supplier Part Number 1: C426102; Voltage Rating: 50V; Temperature Coefficient: C0G; RoHS: Yes; ComponentLink1Description: Datasheet; ComponentLink1URL: https://wmsc.lcsc.com/wmsc/upload/file/pdf/v2/lcsc/2304140030_Murata-Electronics-GJM1555C1HR50CB01D_C426102.pdf; ComponentLink2Description: JLCPCB Part URL; ComponentLink2URL: https://jlcpcb.com/partdetail/C426102; ComponentLink3Description: LCSC Part URL; ComponentLink3URL: https://lcsc.com/product-detail/Multilayer-Ceramic-Capacitors-MLCC---SMD-SMT_Murata-Electronics-Murata-Electronics-GJM1555C1HR50CB01D_C426102.html
footprint CAP-0402 (0402 (1005M) Capacitor)
pins: 1, 2

## GJM1555C1HR50WB01D
designator C?  Capacitance: 0.5pF  (hidden comment: *)
Capacitor, Ceramic (MLCC), 0.5pF, 50V, C0G, SMD 0402; Manufacturer: Murata Electronics; Manufacturer Part Number: GJM1555C1HR50WB01D; Package Size: 0402; JLCPCB Basic Part: No; JLCPCB Part Number: C76912; Supplier 1: LCSC; Category: Capacitors - MLCC; Supplier Part Number 1: C76912; Voltage Rating: 50V; Temperature Coefficient: C0G; RoHS: Yes; ComponentLink1Description: Datasheet; ComponentLink1URL: https://wmsc.lcsc.com/wmsc/upload/file/pdf/v2/lcsc/1811081611_Murata-Electronics-GJM1555C1HR50WB01D_C76912.pdf; ComponentLink2Description: JLCPCB Part URL; ComponentLink2URL: https://jlcpcb.com/partdetail/C76912; ComponentLink3Description: LCSC Part URL; ComponentLink3URL: https://lcsc.com/product-detail/Multilayer-Ceramic-Capacitors-MLCC---SMD-SMT_Murata-Electronics-Murata-Electronics-GJM1555C1HR50WB01D_C76912.html
footprint CAP-0402 (0402 (1005M) Capacitor)
pins: 1, 2

## GJM1555C1HR60BB01D
designator C?  Capacitance: 0.6pF  (hidden comment: *)
Capacitor, Ceramic (MLCC), 0.6pF, 50V, C0G, SMD 0402; Manufacturer: Murata Electronics; Manufacturer Part Number: GJM1555C1HR60BB01D; Package Size: 0402; JLCPCB Basic Part: No; JLCPCB Part Number: C76913; Supplier 1: LCSC; Category: Capacitors - MLCC; Supplier Part Number 1: C76913; Voltage Rating: 50V; Temperature Coefficient: C0G; RoHS: Yes; ComponentLink1Description: Datasheet; ComponentLink1URL: https://wmsc.lcsc.com/wmsc/upload/file/pdf/v2/lcsc/2304140030_Murata-Electronics-GJM1555C1HR60BB01D_C76913.pdf; ComponentLink2Description: JLCPCB Part URL; ComponentLink2URL: https://jlcpcb.com/partdetail/C76913; ComponentLink3Description: LCSC Part URL; ComponentLink3URL: https://lcsc.com/product-detail/Multilayer-Ceramic-Capacitors-MLCC---SMD-SMT_Murata-Electronics-Murata-Electronics-GJM1555C1HR60BB01D_C76913.html
footprint CAP-0402 (0402 (1005M) Capacitor)
pins: 1, 2

## GJM1555C1HR60WB01D
designator C?  Capacitance: 0.6pF  (hidden comment: *)
Capacitor, Ceramic (MLCC), 0.6pF, 50V, C0G, SMD 0402; Manufacturer: Murata Electronics; Manufacturer Part Number: GJM1555C1HR60WB01D; Package Size: 0402; JLCPCB Basic Part: No; JLCPCB Part Number: C88901; Supplier 1: LCSC; Category: Capacitors - MLCC; Supplier Part Number 1: C88901; Voltage Rating: 50V; Temperature Coefficient: C0G; RoHS: Yes; ComponentLink1Description: Datasheet; ComponentLink1URL: https://wmsc.lcsc.com/wmsc/upload/file/pdf/v2/lcsc/2304140030_Murata-Electronics-GJM1555C1HR60WB01D_C88901.pdf; ComponentLink2Description: JLCPCB Part URL; ComponentLink2URL: https://jlcpcb.com/partdetail/C88901; ComponentLink3Description: LCSC Part URL; ComponentLink3URL: https://lcsc.com/product-detail/Multilayer-Ceramic-Capacitors-MLCC---SMD-SMT_Murata-Electronics-Murata-Electronics-GJM1555C1HR60WB01D_C88901.html
footprint CAP-0402 (0402 (1005M) Capacitor)
pins: 1, 2

## GJM1555C1HR70BB01D
designator C?  Capacitance: 0.7pF  (hidden comment: *)
Capacitor, Ceramic (MLCC), 0.7pF, 50V, C0G, SMD 0402; Manufacturer: Murata Electronics; Manufacturer Part Number: GJM1555C1HR70BB01D; Package Size: 0402; JLCPCB Basic Part: No; JLCPCB Part Number: C161349; Supplier 1: LCSC; Category: Capacitors - MLCC; Supplier Part Number 1: C161349; Voltage Rating: 50V; Temperature Coefficient: C0G; RoHS: Yes; ComponentLink1Description: Datasheet; ComponentLink1URL: https://wmsc.lcsc.com/wmsc/upload/file/pdf/v2/lcsc/2304140030_Murata-Electronics-GJM1555C1HR70BB01D_C161349.pdf; ComponentLink2Description: JLCPCB Part URL; ComponentLink2URL: https://jlcpcb.com/partdetail/C161349; ComponentLink3Description: LCSC Part URL; ComponentLink3URL: https://lcsc.com/product-detail/Multilayer-Ceramic-Capacitors-MLCC---SMD-SMT_Murata-Electronics-Murata-Electronics-GJM1555C1HR70BB01D_C161349.html
footprint CAP-0402 (0402 (1005M) Capacitor)
pins: 1, 2